# Altium footprint library pcbSMDv1.PcbLib: 60 footprints (part 1 of 4)
Each footprint in its own frame and in the unit in brackets; x right, y up, seen from the top. Pads: shape width x height; smd on the part's side, far side on the other; paste and mask are expansions set on the pad; w line width, h text height; cw(c..) or ccw(c..) is an arc to the next point about the centre after c.
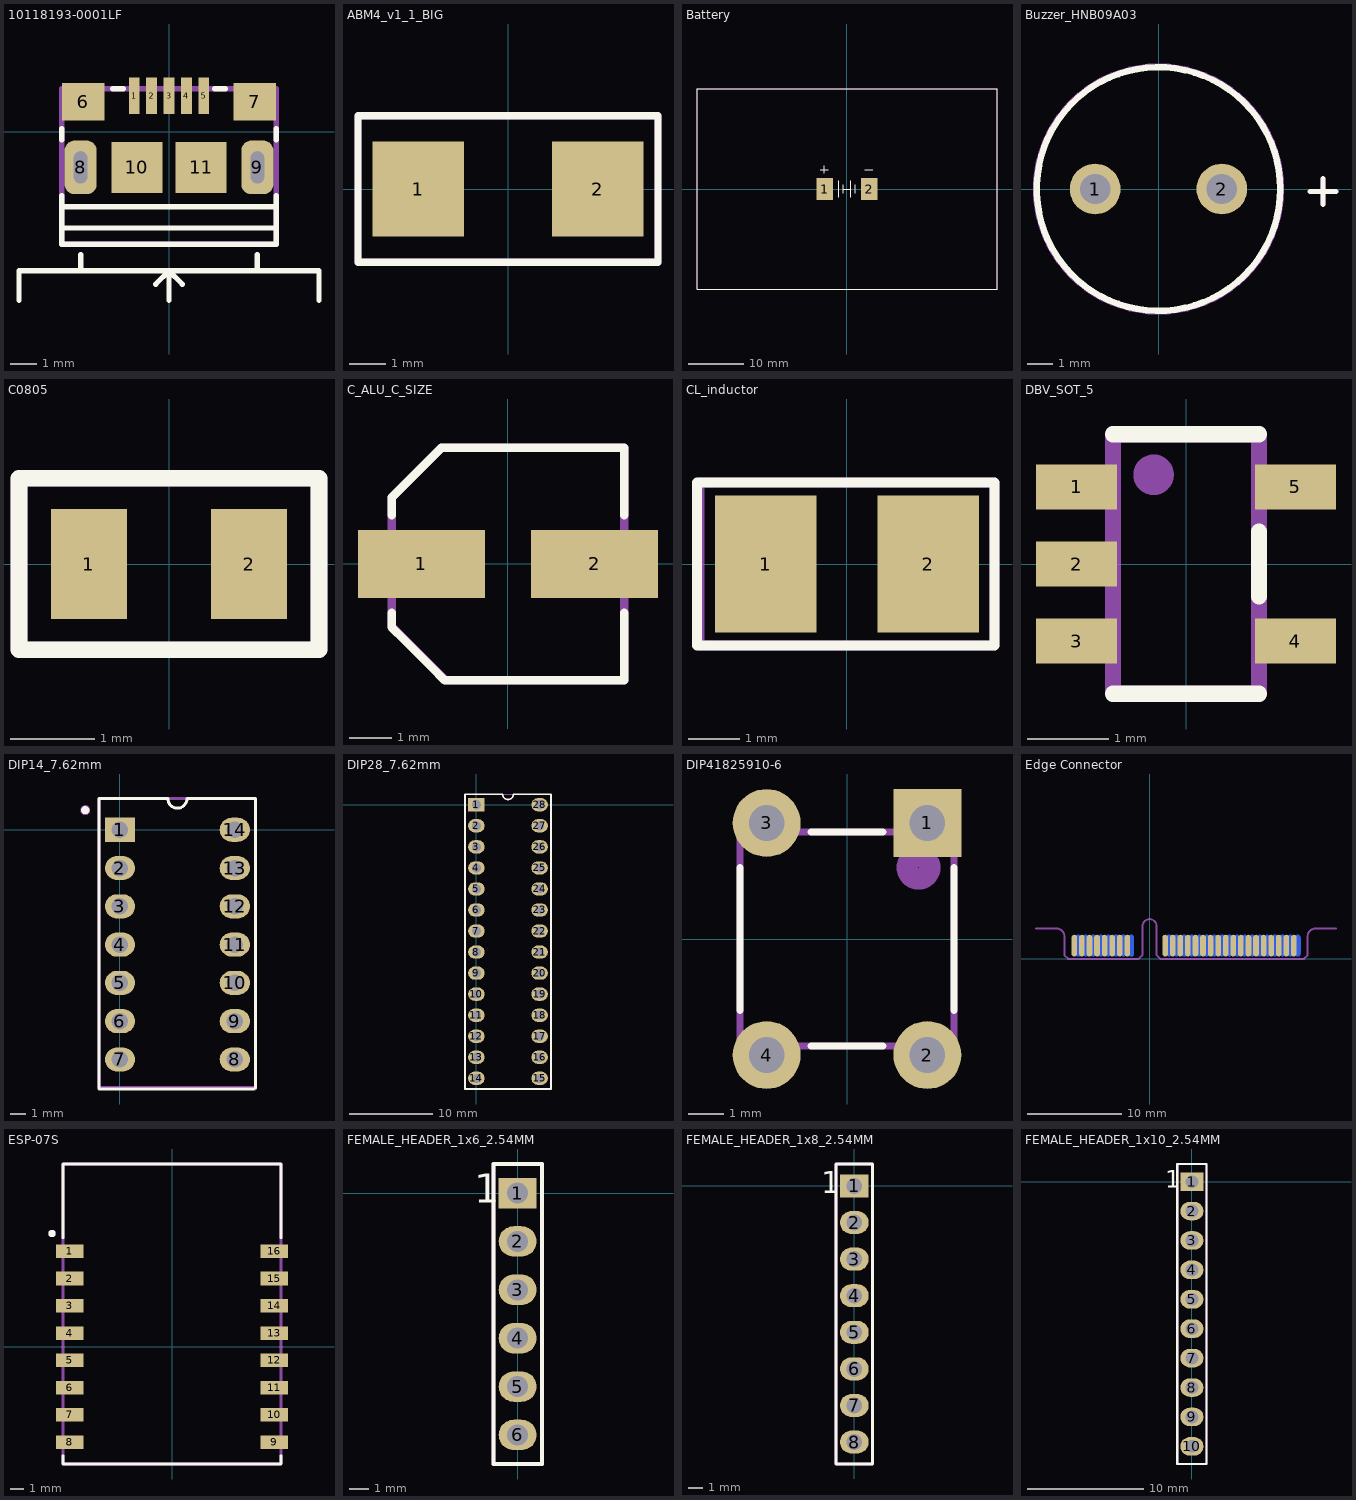
[diagram p0: the footprints below, top view; thin cyan lines are the x and y axes]

## 10118193-0001LF [mm]
pads (11):
  rect 0.4x1.35 smd mask+0.05: 1(-1.3,1.338) 2(-0.65,1.338) 3(0,1.338) 4(0.65,1.338) 5(1.3,1.338)
  rect 1.6x1.4 smd: 6(-3.2,1.112) 7(3.2,1.112)
  rrect60% 1.2x2 hole 0.5 slot 1.2 at 90 deg mask+0.05: 8(-3.3,-1.338) 9(3.3,-1.338)
  rect 1.9x1.9 smd: 10(-1.2,-1.338) 11(1.2,-1.338)
Top Overlay:
  lines w0.2: -5.6,-6.3 -5.6,-5.2 5.6,-5.2 5.6,-6.3 ; -4,-3.6 4,-3.6 ; -4,-2.4 -4,-4.2 4,-4.2 4,-2.4 ; -4,-0.3 -4,0.1 ; -3.9,-2.8 4,-2.8 ; -3.3,-5.2 -3.3,-4.6 ; -2.1,1.6 -1.7,1.6 ; -0.5,-5.7 0,-5.2 ; 0,-6.3 0,-5.2 ; 0.5,-5.7 0,-5.2 ; 1.7,1.6 2.1,1.6 ; 3.3,-5.2 3.3,-4.6 ; 4,-0.3 4,0.1
Mechanical 24:
  lines w0.2: -4,-4.2 -4,1.6 4,1.6 4,-4.2 -4,-4.2
  text ".Designator" at -1.246,-1.738 h1.52
3D body "10118193-0001lfc.stp": height 2.88, standoff -0.92, extent -3.932,-4.204 3.925,1.579

## ABM4_v1_1_BIG [mm]
pads (2):
  rect 2.5x2.6 smd: 1(-2.45,0) 2(2.45,0)
Top Overlay:
  lines w0.2: -4.1,-2 -4.1,2 4.1,2 4.1,-2 -4.1,-2
Mechanical 24:
  lines w0.2: -4.1,-2 -4.1,2 4.1,2 4.1,-2 -4.1,-2
  text ".Designator" at -2.046,-0.638 h1.52
3D body "User Library-Xtal-ABM7.STEP": height 1.41, standoff 0.01, extent -3.1,-1.85 3.1,1.85

## Battery [mm]
pads (2):
  rect 3x4 smd: 1(-4,0) 2(4,0)
Top Overlay:
  lines w0.15: -27,-18 27,-18 27,18 -27,18 -27,-18
  lines w0.2: -4.8,3.5 -3.4,3.5 ; -4.1,2.8 -4.1,4.2 ; -1.5,-1.5 -1.5,1.5 ; -0.7,-0.8 -0.7,0.8 ; -0.7,0 0.7,0 ; 0.7,-1.5 0.7,1.5 ; 1.5,-0.8 1.5,0.8 ; 3.2,3.5 4.6,3.5
Mechanical 24:
  lines w0.15: -27,-18 27,-18 27,18 -27,18 -27,-18
  text ".Designator" at -3.746,6.762 h1.52
3D body "Bateria LiPo 3.7V 1000mA 503450 v23.step": height 6.16, standoff 0.16, extent -26.6,-29.211 26.5,17.611

## Buzzer_HNB09A03 [mm]
pads (2):
  round 2 hole 1.2: 1(-2.5,0) 2(2.5,0)
Top Overlay:
  circle w0.254: c0,0 r4.809
  lines w0.2: 5.992,-0.1 7.008,-0.1 ; 6.5,-0.608 6.5,0.408
Mechanical 24:
  circle w0.254: c0,0 r4.837
  lines w0.2: 6,-0.1 7,-0.1 ; 6.5,-0.6 6.5,0.4
  text ".Designator" at -0.646,1.562 h1.52
3D body "buzzer.STEP": height 5, standoff -5.5, extent -4.75,-4.75 4.75,4.75

## C0805 [mm]
pads (2):
  rect 0.9x1.3 smd: 1(-0.95,0) 2(0.95,0)
Top Overlay:
  lines w0.2: -1.778,-1.016 -1.778,1.016 1.778,1.016 1.778,-1.016 -1.778,-1.016
Mechanical 24:
  lines w0.2: -1.778,-1.016 -1.778,1.016 0.254,1.016 1.778,1.016 1.778,-1.016 -1.778,-1.016
  text ".Designator" at -1.118,-0.525 h1.02
3D body "c0805x472j2gacauto.stp": height 1.53, standoff -0.02, extent -1.15,-0.508 1.15,0.492

## C_ALU_C_SIZE [mm]
pads (2):
  rect 3x1.6 smd: 1(-2.05,0) 2(2.05,0)
Top Overlay:
  lines w0.2: -2.75,-1.15 -2.75,-1.5 -2.438,-1.812 -1.813,-2.437 -1.5,-2.75 2.75,-2.75 2.75,-1.15 ; -2.75,1.15 -2.75,1.575 -2.456,1.869 -1.869,2.456 -1.575,2.75 2.75,2.75 2.75,1.15
Mechanical 24:
  lines w0.2: -2.75,-1.475 -2.75,1.575 -1.575,2.75 2.75,2.75 2.75,-2.75 -1.475,-2.75 -2.75,-1.475
  text ".Designator" at -1.846,-0.538 h1.52
3D body "User Library-capacitor size C.step": height 5.41, standoff -0.01, extent -2.925,-2.625 2.975,2.675

## CL_inductor [mm]
pads (2):
  rect 2x2.7 smd: 1(-1.6,0) 2(1.6,0)
Top Overlay:
  lines w0.2: -2.95,-1.6 -2.95,0 -2.95,1.6 2.9,1.6 2.9,-1.6 -2.95,-1.6
Mechanical 24:
  lines w0.2: -2.9,-1.6 -2.9,1.6 2.9,1.6 2.9,-1.6 -2.9,-1.6
  text ".Designator" at -1.346,-0.538 h1.52
3D body: height 2.7, standoff -0.01, extent -1.4,-1.25 1.4,1.25
3D body: height 2.7, standoff -0.01, extent 1.4,-1.25 1.7,1.25
3D body: height 2.7, standoff -0.01, extent -1.7,-1.25 -1.4,1.25

## DBV_SOT_5 [mm]
pads (5):
  rect 1x0.55 smd: 1(-1.35,0.95) 2(-1.35,0) 3(-1.35,-0.95) 4(1.35,-0.95) 5(1.35,0.95)
Top Overlay:
  lines w0.2: -0.9,-1.6 0.9,-1.6 ; -0.9,1.6 0.9,1.6 ; 0.9,-0.4 0.9,0.4
Mechanical 24:
  circle w0.3: c-0.4,1.1 r0.1
  lines w0.2: -0.9,-1.6 -0.9,-1.4 -0.9,1.6 0.9,1.6 0.9,-1.6 -0.9,-1.6
  text ".Designator" at -0.317,0.85 h1
3D body "User Library-TPS79333DBVR.STEP": height 1.6, standoff -0.02, extent -1.527,-1.525 1.5,1.525

## DIP14_7.62mm [mm]
pads (14):
  rect 2x1.6 hole 1.1: 1(0,0)
  oval 2x1.6 hole 1.1: 2(0,-2.54) 3(0,-5.08) 4(0,-7.62) 5(0,-10.16) 6(0,-12.7) 7(0,-15.24) 8(7.62,-15.24) 9(7.62,-12.7) 10(7.62,-10.16) 11(7.62,-7.62) 12(7.62,-5.08) 13(7.62,-2.54) 14(7.62,0)
Top Overlay:
  circle w0.254: c-2.3,1.3 r0.141
  lines w0.2: -1.39,-17.19 -1.39,2.07 3.175,2.07 ccw(c3.81,2.07) 4.445,2.07 9.01,2.07 9.01,-17.09 8.9,-17.2 -1.38,-17.2 -1.39,-17.19
Mechanical 24:
  circle w1: c0.01,-0.01 r0.141
  circle w0.254: c-2.3,1.3 r0.2
  lines w0.125: -1.39,2.09 9.01,2.09
  lines w0.2: -1.4,-17.1 8.9,-17.1 9,-17.2 9,2.08 9.01,2.09 -1.39,2.09 -1.39,-17.09 -1.4,-17.1
  text ".Designator" at 4.8,-15.8 h3
3D body "CircuitWorks-DIP-14.step": height 4.01, standoff -2.97, extent -0.2,-17.125 7.8,1.925

## DIP28_7.62mm [mm]
pads (28):
  rect 2x1.6 hole 1.1: 1(0,0)
  oval 2x1.6 hole 1.1: 2(0,-2.54) 3(0,-5.08) 4(0,-7.62) 5(0,-10.16) 6(0,-12.7) 7(0,-15.24) 8(0,-17.78) 9(0,-20.32) 10(0,-22.86) 11(0,-25.4) 12(0,-27.94) 13(0,-30.48) 14(0,-33.02) 15(7.62,-33.02) 16(7.62,-30.48) 17(7.62,-27.94) 18(7.62,-25.4) 19(7.62,-22.86) 20(7.62,-20.32) 21(7.62,-17.78) 22(7.62,-15.24) 23(7.62,-12.7) 24(7.62,-10.16) 25(7.62,-7.62) 26(7.62,-5.08) 27(7.62,-2.54) 28(7.62,0)
Top Overlay:
  lines w0.2: -1.39,-34.31 -1.39,1.27 3.175,1.27 ccw(c3.81,1.27) 4.445,1.27 9.01,1.27 9.01,-34.31 -1.39,-34.31
Mechanical 24:
  circle w1: c0.01,-0.01 r0.141
  lines w0.125: -1.39,-34.31 -1.39,1.29 9.01,1.29 9.01,-34.31 -1.39,-34.31
  text ".Designator" at 5.31,-21.61 h3
3D body "User Library-DIP-28P-M04.step": height 5.2, standoff -3, extent -0.06,-34.21 7.81,1.19

## DIP41825910-6 [mm]
pads (4):
  rect 1.9x1.9 hole 1: 1(2.25,3.25)
  round 1.9 hole 1: 2(2.25,-3.25) 3(-2.25,3.25) 4(-2.25,-3.25)
Top Overlay:
  lines w0.2: -3,-2 -3,2 ; -1,-3 1,-3 ; -1,3 1,3 ; 3,-2 3,2
Mechanical 24:
  circle w0.6: c2,2 r0.316
  lines w0.2: -3,-3 3,-3 3,3 -3,3 -3,-3
  text ".Designator" at -1.646,-0.738 h1.52
3D body "User Library-FSM4JLH(1825910-5).STEP": height 5, standoff -3.51, extent -2.995,-3.899 2.995,3.9

## Edge Connector [mm]
pads (52):
  oval 0.6x2.3 smd mask+0: 1(-7.95,1.4) 3(-7.15,1.4) 5(-6.35,1.4) 7(-5.55,1.4) 9(-4.75,1.4) 11(-3.95,1.4) 13(-3.15,1.4) 15(-2.35,1.4) 17(1.65,1.4) 19(2.45,1.4) 21(3.25,1.4) 23(4.05,1.4) 25(4.85,1.4) 27(5.65,1.4) 29(6.45,1.4) 31(7.25,1.4) 33(8.05,1.4) 35(8.85,1.4) 37(9.65,1.4) 39(10.45,1.4) 41(11.25,1.4) 43(12.05,1.4) 45(12.85,1.4) 47(13.65,1.4) 49(14.45,1.4) 51(15.25,1.4)
  oval 0.6x2.3 smd far side mask+0: 2(-7.55,1.4) 4(-6.75,1.4) 6(-5.95,1.4) 8(-5.15,1.4) 10(-4.35,1.4) 12(-3.55,1.4) 14(-2.75,1.4) 16(-1.95,1.4) 18(2.05,1.4) 20(2.85,1.4) 22(3.65,1.4) 24(4.45,1.4) 26(5.25,1.4) 28(6.05,1.4) 30(6.85,1.4) 32(7.65,1.4) 34(8.45,1.4) 36(9.25,1.4) 38(10.05,1.4) 40(10.85,1.4) 42(11.65,1.4) 44(12.45,1.4) 46(13.25,1.4) 48(14.05,1.4) 50(14.85,1.4) 52(15.65,1.4)
Top Solder:
  region: -9.8,3.2 17.5,3.2 17.5,0 -9.8,0
Bottom Solder:
  region: -9.8,3.2 17.5,3.2 17.5,0 -9.8,0
Board Shape:
  lines w0.2: -12,3.2 -9.8,3.2 cw(c-9.8,2.4) -9,2.4 -9,0.4 -8.6,0 -1.15,0 -0.75,0.4 -0.75,3.45 cw(c0,3.45) 0.75,3.45 0.75,0.4 1.15,0 16.3,0 16.7,0.4 16.7,2.4 cw(c17.5,2.4) 17.5,3.2 19.7,3.2

## ESP-07S [mm]
pads (16):
  rect 2x1 smd: 1(-7.5,7) 2(-7.5,5) 3(-7.5,3) 4(-7.5,1) 5(-7.5,-1) 6(-7.5,-3) 7(-7.5,-5) 8(-7.5,-7) 9(7.5,-7) 10(7.5,-5) 11(7.5,-3) 12(7.5,-1) 13(7.5,1) 14(7.5,3) 15(7.5,5) 16(7.5,7)
Top Overlay:
  circle w0.254: c-8.8,8.3 r0.141
  lines w0.2: -8,-8 -8,-8.6 8,-8.6 8,-8 ; -8,8 -8,13.4 8,13.4 8,8
Mechanical 24:
  circle w0.254: c-8.8,8.3 r0.141
  lines w0.2: -8,-8.6 -8,13.4 8,13.4 8,-8.5 7.9,-8.6 -8,-8.6
  text ".Designator" at 0.638,-5.346 h1.52
3D body "User Library-ESP07-1.STEP": height 3.5, standoff -0.01, extent -8,-8.6 8,13.4

## FEMALE_HEADER_1x6_2.54MM [mm]
pads (6):
  rect 2x1.6 hole 1.1: 1(0,0)
  oval 2x1.6 hole 1.1: 2(0,-2.54) 3(0,-5.08) 4(0,-7.62) 5(0,-10.16) 6(0,-12.7)
Top Overlay:
  lines w0.2: -1.27,-14.224 -0.635,-14.224 0.635,-14.224 1.27,-14.224 1.27,1.524 -1.27,1.524 -1.27,-14.224
  text "1" at -2.286,-0.508 h1.52
Mechanical 24:
  circle w0.5: c0,0 r0.359
  lines w0.2: -1.27,-14.224 -1.27,1.524 1.27,1.524 1.27,-14.224 -1.27,-14.224
  text ".Designator" at 0.762,-9.144 h1.52
3D body "m20-7820642_asm.stp": height 8.61, standoff -2.89, extent -1.25,-14.17 1.25,1.47

## FEMALE_HEADER_1x8_2.54MM [mm]
pads (8):
  rect 2x1.6 hole 1.1: 1(0,0)
  oval 2x1.6 hole 1.1: 2(0,-2.54) 3(0,-5.08) 4(0,-7.62) 5(0,-10.16) 6(0,-12.7) 7(0,-15.24) 8(0,-17.78)
Top Overlay:
  lines w0.2: -1.27,-19.304 -0.635,-19.304 0.635,-19.304 1.27,-19.304 1.27,1.524 -1.27,1.524 -1.27,-19.304
  text "1" at -2.286,-0.508 h1.52
Mechanical 24:
  circle w0.5: c0,0 r0.359
  lines w0.2: -1.27,-19.304 -1.27,1.524 1.27,1.524 1.27,-19.304 -1.27,-19.304
  text ".Designator" at 0.508,-16.764 h1.52
3D body "m20-7820842_asm.stp": height 8.61, standoff -2.89, extent -1.25,-19.304 1.25,1.416

## FEMALE_HEADER_1x10_2.54MM [mm]
pads (10):
  rect 2x1.6 hole 1.1: 1(0,0)
  oval 2x1.6 hole 1.1: 2(0,-2.54) 3(0,-5.08) 4(0,-7.62) 5(0,-10.16) 6(0,-12.7) 7(0,-15.24) 8(0,-17.78) 9(0,-20.32) 10(0,-22.86)
Top Overlay:
  lines w0.2: -1.27,-24.384 -1.27,1.524 1.27,1.524 1.27,-24.384 -1.27,-24.384
  text "1" at -2.286,-0.508 h1.52
Mechanical 24:
  circle w0.5: c0,0 r0.359
  lines w0.2: -1.27,-24.384 1.27,-24.384 1.27,1.524 -1.27,1.524 -1.27,-24.384
  text ".Designator" at 0.508,-16.764 h1.52
3D body "m20-7821046_asm.stp": height 8.59, standoff -2.91, extent -1.23,-24.33 1.27,1.47